# Altium footprint library ICPOWER.PcbLib: 71 footprints (part 1 of 5)
Each footprint in its own frame and in the unit in brackets; x right, y up, seen from the top. Pads: shape width x height; smd on the part's side, far side on the other; paste and mask are expansions set on the pad; w line width, h text height; cw(c..) or ccw(c..) is an arc to the next point about the centre after c.
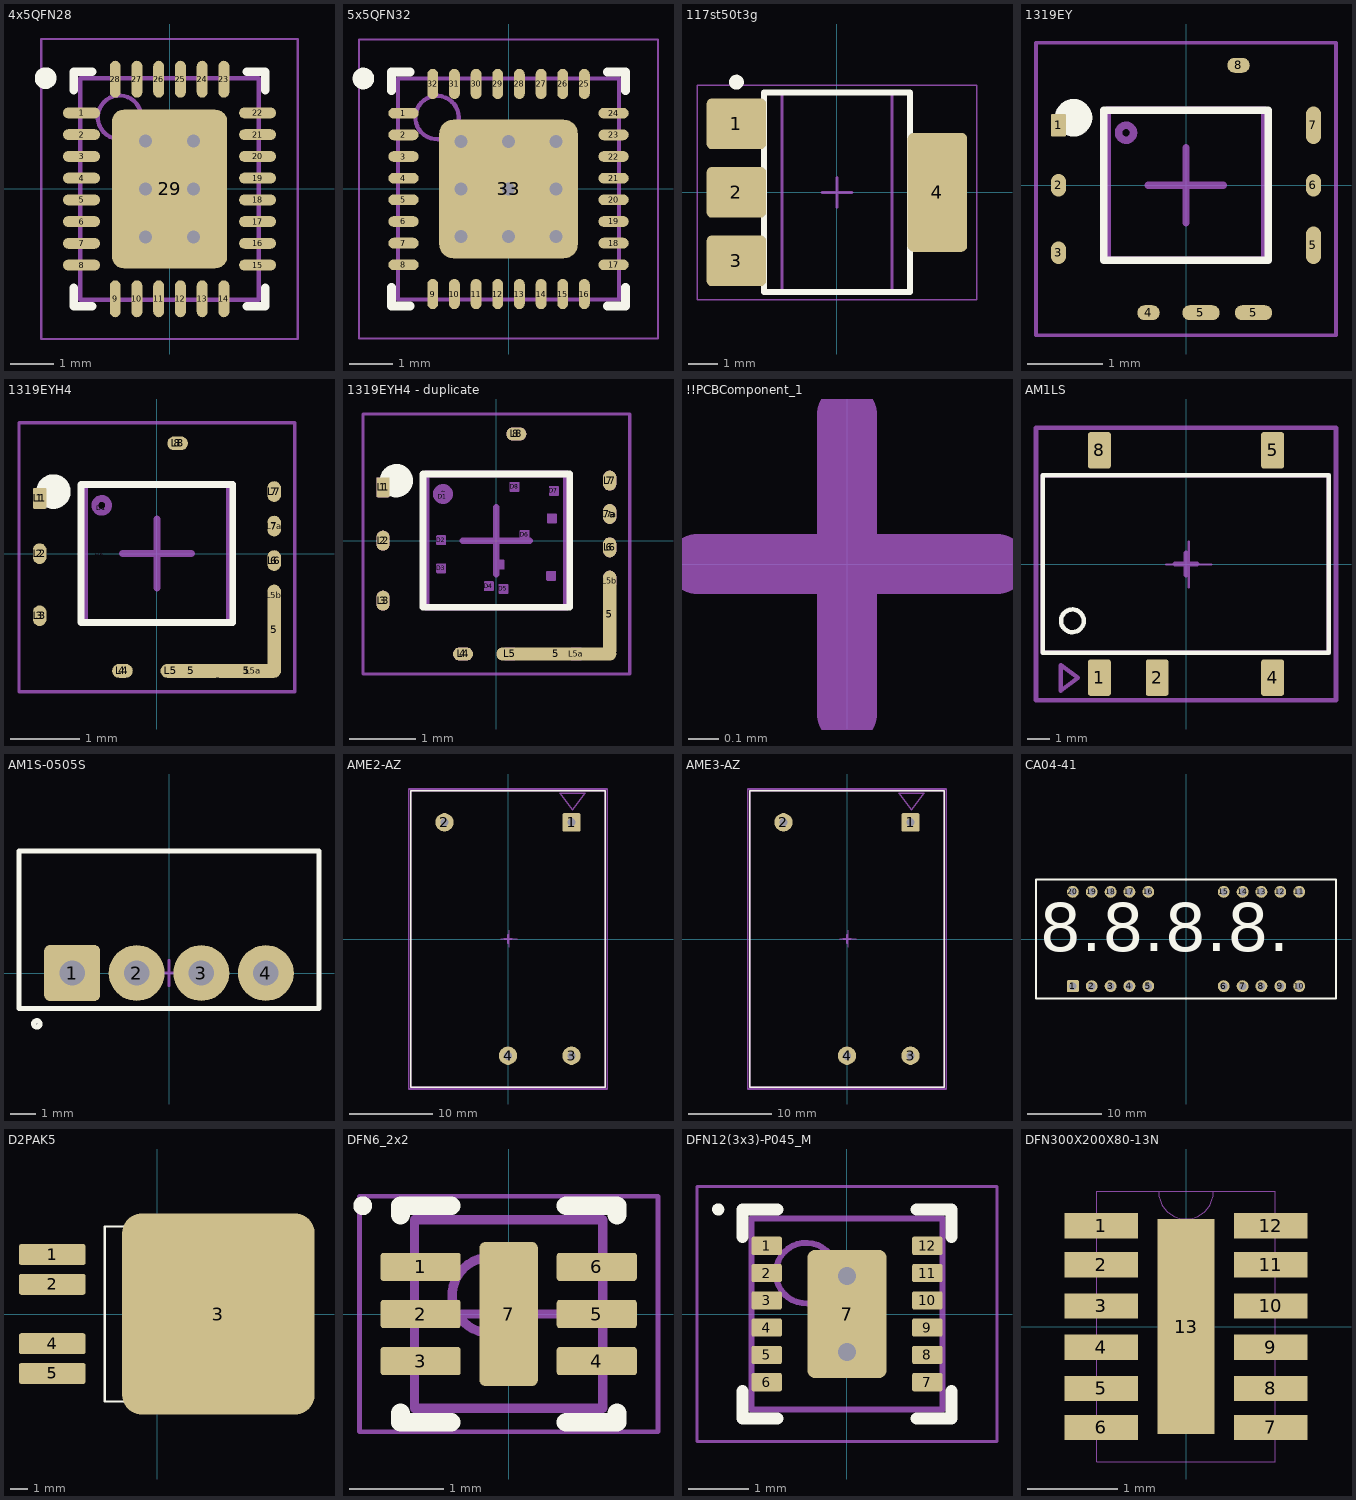
[diagram p0: the footprints below, top view; thin cyan lines are the x and y axes]

## 4x5QFN28 [mm] "QFN, 28-Leads, 4x5, IPC Low Density"
height 0.8
pads (29):
  oval 0.85x0.25 smd: 1(-2.025,1.75) 2(-2.025,1.25) 3(-2.025,0.75) 4(-2.025,0.25) 5(-2.025,-0.25) 6(-2.025,-0.75) 7(-2.025,-1.25) 8(-2.025,-1.75) 15(2.025,-1.75) 16(2.025,-1.25) 17(2.025,-0.75) 18(2.025,-0.25) 19(2.025,0.25) 20(2.025,0.75) 21(2.025,1.25) 22(2.025,1.75)
  oval 0.25x0.85 smd: 9(-1.25,-2.525) 10(-0.75,-2.525) 11(-0.25,-2.525) 12(0.25,-2.525) 13(0.75,-2.525) 14(1.25,-2.525) 23(1.25,2.525) 24(0.75,2.525) 25(0.25,2.525) 26(-0.25,2.525) 27(-0.75,2.525) 28(-1.25,2.525)
  rrect20% 2.65x3.65 smd: 29(0,0)
via 0.55,-1.1 diameter 0.6 hole 0.3
via -0.55,-1.1 diameter 0.6 hole 0.3
via 0.55,0 diameter 0.6 hole 0.3
via -0.55,0 diameter 0.6 hole 0.3
via 0.55,1.1 diameter 0.6 hole 0.3
via -0.55,1.1 diameter 0.6 hole 0.3
Top Overlay:
  circle w0.25: c-2.85,2.55 r0.125
  lines w0.2: -2.2,-2.275 -2.2,-2.7 -1.775,-2.7 ; -2.2,2.275 -2.2,2.7 -1.775,2.7 ; 1.775,-2.7 2.2,-2.7 2.2,-2.275 ; 1.775,2.7 2.2,2.7 2.2,2.275
Mechanical 13:
  circle w0.1: c-1.15,1.65 r0.5
  lines w0.1: -2.05,-2.55 2.05,-2.55 2.05,2.55 -2.05,2.55 -2.05,-2.55
Mechanical 15:
  lines w0.05: -2.95,-3.45 2.95,-3.45 2.95,3.45 -2.95,3.45 -2.95,-3.45
  lines w0.1: -0.5,0 0.5,0 ; 0,-0.5 0,0.5
3D body: height 0.8, standoff 0.03, extent -2.05,-2.55 2.05,2.55

## 5x5QFN32 [mm] "QFN, 32-Leads, 5x5, IPC Low Density"
height 0.8
pads (33):
  oval 0.7x0.25 smd: 1(-2.425,1.75) 2(-2.425,1.25) 3(-2.425,0.75) 4(-2.425,0.25) 5(-2.425,-0.25) 6(-2.425,-0.75) 7(-2.425,-1.25) 8(-2.425,-1.75) 17(2.425,-1.75) 18(2.425,-1.25) 19(2.425,-0.75) 20(2.425,-0.25) 21(2.425,0.25) 22(2.425,0.75) 23(2.425,1.25) 24(2.425,1.75)
  oval 0.25x0.7 smd: 9(-1.75,-2.425) 10(-1.25,-2.425) 11(-0.75,-2.425) 12(-0.25,-2.425) 13(0.25,-2.425) 14(0.75,-2.425) 15(1.25,-2.425) 16(1.75,-2.425) 25(1.75,2.425) 26(1.25,2.425) 27(0.75,2.425) 28(0.25,2.425) 29(-0.25,2.425) 30(-0.75,2.425) 31(-1.25,2.425) 32(-1.75,2.425)
  rrect20% 3.2x3.2 smd: 33(0,0)
via -1.1,1.1 diameter 0.6 hole 0.3
via 0,1.1 diameter 0.6 hole 0.3
via 1.1,1.1 diameter 0.6 hole 0.3
via -1.1,0 diameter 0.6 hole 0.3
via 0,0 diameter 0.6 hole 0.3
via 1.1,0 diameter 0.6 hole 0.3
via -1.1,-1.1 diameter 0.6 hole 0.3
via 0,-1.1 diameter 0.6 hole 0.3
via 1.1,-1.1 diameter 0.6 hole 0.3
Top Overlay:
  circle w0.25: c-3.35,2.55 r0.125
  lines w0.2: -2.7,-2.275 -2.7,-2.7 -2.275,-2.7 ; -2.7,2.275 -2.7,2.7 -2.275,2.7 ; 2.275,-2.7 2.7,-2.7 2.7,-2.275 ; 2.275,2.7 2.7,2.7 2.7,2.275
Mechanical 13:
  circle w0.1: c-1.65,1.65 r0.5
  lines w0.1: -2.55,-2.55 -2.55,2.55 2.55,2.55 2.55,-2.55 -2.55,-2.55
Mechanical 15:
  lines w0.05: -3.45,-3.45 -3.45,3.45 3.45,3.45 3.45,-3.45 -3.45,-3.45
  lines w0.1: -0.5,0 0.5,0 ; 0,-0.5 0,0.5
3D body: height 0.8, standoff 0.03, extent -2.55,-2.55 2.55,2.55

## 117st50t3g [mm] "117st50t3g"
height 1.8
pads (4):
  rrect20% 2x1.7 smd: 1(-3.375,2.3) 2(-3.375,0) 3(-3.375,-2.3)
  rrect20% 2x4 smd: 4(3.375,0)
Top Overlay:
  circle w0.25: c-3.375,3.7 r0.125
  lines w0.2: -2.45,-3.35 -2.45,3.35 2.45,3.35 2.45,-3.35 -2.45,-3.35
Mechanical 13:
  lines w0.1: -1.85,-3.35 -1.85,3.35 1.85,3.35 1.85,-3.35 -1.85,-3.35
Mechanical 15:
  lines w0.05: -4.699,-3.6 -4.699,3.6 4.699,3.6 4.699,-3.6 -4.699,-3.6
  lines w0.1: -0.5,0 0.5,0 ; 0,-0.5 0,0.5
3D body "SOT-223.step": height 1.7, standoff 0.02, extent -3.48,-3.25 3.48,3.25

## 1319EY [mm] "1319EY crystal"
height 1.75
pads (10):
  rrect20% 0.2x0.3 smd: 1(-1.7,0.8)
  oval 0.2x0.3 smd: 2(-1.7,0) 3(-1.7,-0.9) 6(1.7,0)
  oval 0.3x0.2 smd: 4(-0.5,-1.7) 8(0.7,1.6)
  oval 0.5x0.2 smd: 5(0.2,-1.7) 5(0.9,-1.7)
  oval 0.2x0.5 smd: 5(1.7,-0.8) 7(1.7,0.8)
Top Overlay:
  circle w0.25: c-1.5,0.9 r0.125
  lines w0.1: -1.1,-1 -1.1,1 1.1,1 1.1,-1 -1.1,-1
Mechanical 13:
  circle w0.1: c-0.8,0.7 r0.1
  lines w0.1: -1.05,-1 -1.05,1 1.05,1 1.05,-1 -1.05,-1
Mechanical 15:
  lines w0.05: -2,-2 -2,1.9 2,1.9 2,-2 -2,-2
  lines w0.1: -0.5,0 0.5,0 ; 0,-0.5 0,0.5

## 1319EYH4 [mm] "1319EY crystal"
height 1.75
pads (33):
  rrect20% 0.2x0.3 smd: 1(-1.7,0.8)
  oval 0.2x0.3 smd: 2(-1.7,0) 3(-1.7,-0.9) 6(1.7,-0.1) 7(1.7,0.4) 7(1.7,0.9)
  oval 0.3x0.2 smd: 4(-0.5,-1.7) 8(0.3,1.6)
  oval 0.9x0.2 smd: 5(0.5,-1.7)
  oval 1x0.2 smd: 5(1.3,-1.7)
  oval 0.2x1.3 smd: 5(1.7,-1.1)
  rrect20% 0.15x0.15 on Mid1: D1(-0.806,0.66) D2(-0.827,0.007) D3(-0.827,-0.415) D4(-0.112,-0.683) D5(0.106,-0.723) D5a(0.051,-0.36) D5b(0.823,-0.527) D6(0.425,0.088) D7(0.864,0.746) D7a(0.834,0.333) D8(0.273,0.807)
  rrect20% 0.2x0.3 on Mid1: L1(-1.7,0.8)
  oval 0.2x0.3 on Mid1: L2(-1.7,0) L3(-1.7,-0.9) L5b(1.7,-0.6) L6(1.7,-0.1) L7(1.7,0.9) L7a(1.7,0.4)
  oval 0.3x0.2 on Mid1: L4(-0.5,-1.7) L5(0.2,-1.7) L5a(1.4,-1.7) L8(0.3,1.6)
Top Overlay:
  circle w0.25: c-1.5,0.9 r0.125
  lines w0.1: -1.1,-1 1.1,-1 1.1,1 -1.1,1 -1.1,-1
Mechanical 13:
  circle w0.1: c-0.8,0.7 r0.1
  lines w0.1: -1.05,-1 1.05,-1 1.05,1 -1.05,1 -1.05,-1
Mechanical 15:
  lines w0.05: -2,-2 2,-2 2,1.9 -2,1.9 -2,-2
  lines w0.1: -0.5,0 0.5,0 ; 0,-0.5 0,0.5

## 1319EYH4 - duplicate [mm] "1319EY crystal"
height 1.75
pads (32):
  rrect20% 0.2x0.3 smd: 1(-1.7,0.8)
  oval 0.2x0.3 smd: 2(-1.7,0) 3(-1.7,-0.9) 6(1.7,-0.1) 7(1.7,0.9) 7a(1.7,0.4)
  oval 0.3x0.2 smd: 4(-0.5,-1.7) 8(0.3,1.6)
  oval 1.8x0.2 smd: 5(0.9,-1.7)
  oval 0.2x1.3 smd: 5(1.7,-1.1)
  rrect20% 0.15x0.15 on Mech32: D1(-0.806,0.66) D2(-0.827,0.007) D3(-0.827,-0.415) D4(-0.112,-0.683) D5(0.106,-0.723) D5a(0.051,-0.36) D5b(0.823,-0.527) D6(0.425,0.088) D7(0.864,0.746) D7a(0.834,0.333) D8(0.273,0.807)
  rrect20% 0.2x0.3 on Mech32: L1(-1.7,0.8)
  oval 0.2x0.3 on Mech32: L2(-1.7,0) L3(-1.7,-0.9) L5b(1.7,-0.6) L6(1.7,-0.1) L7(1.7,0.9) L7a(1.7,0.4)
  oval 0.3x0.2 on Mech32: L4(-0.5,-1.7) L5(0.2,-1.7) L5a(1.2,-1.7) L8(0.3,1.6)
Top Overlay:
  circle w0.25: c-1.5,0.9 r0.125
  lines w0.1: -1.1,-1 1.1,-1 1.1,1 -1.1,1 -1.1,-1
Mechanical 13:
  circle w0.1: c-0.8,0.7 r0.1
  lines w0.1: -1.05,-1 1.05,-1 1.05,1 -1.05,1 -1.05,-1
Mechanical 15:
  lines w0.05: -2,-2 2,-2 2,1.9 -2,1.9 -2,-2
  lines w0.1: -0.5,0 0.5,0 ; 0,-0.5 0,0.5

## !!PCBComponent_1 [mm]
M3_comm_top:
  text ".comment" at -0.9,-0.3 h1
M5_asm_top:
  text ".Designator" at -1,1.3 h1
M7_courtyard_top:
  lines w0.2: -0.5,0 0.5,0 ; 0,-0.5 0,0.5

## AM1LS [mm] "AM1LS-0505S-NZ"
pads (5):
  rrect20% 1x1.6 smd: 1(-3.81,-5) 2(-1.27,-5) 4(3.81,-5) 5(3.81,5) 8(-3.81,5)
Top Overlay:
  circle w0.2: c-5,-2.5 r0.5
  lines w0.2: -6.31,-3.9 6.29,-3.9 6.29,3.9 -6.31,3.9 -6.31,-3.9
M3_comm_top:
  text ".comment" at -3.01,-0.55 h2
M5_asm_top:
  lines w0.2: -6.31,-3.9 -6.31,3.9 6.29,3.9 6.29,-3.9 -6.31,-3.9 ; -5.51,-5.575 -4.757,-5.01 -5.51,-4.445 -5.51,-5.575
  text ".Designator" at -3.11,6.45 h2
M7_courtyard_top:
  lines w0.2: -0.5,0 0.5,0 ; 0,-0.5 0,0.5 ; -6.6,-6 -6.6,6 6.6,6 6.6,-6 -6.6,-6
Mechanical 15:
  lines w0.1: -0.88,-0.02 1.12,-0.02 ; 0.12,-1.02 0.12,0.98
3D body "AM1LS-NZ.step": height 7, standoff 0, extent -6.35,-5.6 6.35,5.6

## AM1S-0505S [mm] "AM1S-0505SH30Z"
pads (4):
  rrect20% 2.2x2.2 hole 1: 1(-3.81,0)
  round 2.2 hole 1: 2(-1.27,0) 3(1.27,0) 4(3.81,0)
Top Overlay:
  circle w0.2: c-5.2,-2 r0.125
  lines w0.2: -5.9,-1.4 -5.9,4.8 5.9,4.8 5.9,-1.4 -5.9,-1.4
M3_comm_top:
  text ".comment" at 0,0 h1
M5_asm_top:
  circle w0.1: c-5.2,-2 r0.1
  lines w0.1: -5.9,-1.4 5.9,-1.4 5.9,4.8 -5.9,4.8 -5.9,-1.4
  text ".Designator" at -1.5,5 h1
M7_courtyard_top:
  lines w0.1: -0.5,0 0.5,0 ; 0,-0.5 0,0.5
3D body "User Library-AM1S-Z.STEP": height 10.15, standoff -3.05, extent -5.842,-1.35 5.842,4.75

## AME2-AZ [mm] "AME2-AZ"
pads (4):
  rrect20% 2.2x2.2 hole 1: 1(7.62,14)
  round 2.2 hole 1: 2(-7.62,14) 3(7.62,-14) 4(0,-14)
Top Overlay:
  lines w0.2: -11.655,-17.8 11.655,-17.8 11.655,17.8 -11.655,17.8 -11.655,-17.8
M3_comm_top:
  text ".comment" at -3,-0.5 h2
M5_asm_top:
  lines w0.2: -11.655,-17.8 -11.655,17.8 11.655,17.8 11.655,-17.8 -11.655,-17.8 ; 6.24,17.5 7.74,15.5 9.24,17.5 6.24,17.5
  text ".Designator" at -2.2,16.5 h2
M7_courtyard_top:
  lines w0.2: -0.5,0 0.5,0 ; 0,-0.5 0,0.5 ; -11.9,-18 11.9,-18 11.9,18 -11.9,18 -11.9,-18
Mechanical 15:
  lines w0.1: -0.87,0.03 1.13,0.03 ; 0.13,-0.97 0.13,1.03
3D body "AME2-24SBAZ.STEP": height 19.32, standoff -4.1, extent -11.655,-17.8 11.655,17.8

## AME3-AZ [mm] "AME3-AZ"
pads (4):
  rrect20% 2.2x2.2 hole 1: 1(7.62,14)
  round 2.2 hole 1: 2(-7.62,14) 3(7.62,-14) 4(0,-14)
Top Overlay:
  lines w0.2: -11.655,-17.8 11.655,-17.8 11.655,17.8 -11.655,17.8 -11.655,-17.8
M3_comm_top:
  text ".comment" at -3,-0.5 h2
M5_asm_top:
  lines w0.2: -11.655,-17.8 -11.655,17.8 11.655,17.8 11.655,-17.8 -11.655,-17.8 ; 6.24,17.5 7.74,15.5 9.24,17.5 6.24,17.5
  text ".Designator" at -2.2,16.5 h2
M7_courtyard_top:
  lines w0.2: -0.5,0 0.5,0 ; 0,-0.5 0,0.5 ; -11.9,-18 11.9,-18 11.9,18 -11.9,18 -11.9,-18
Mechanical 15:
  lines w0.1: -0.87,0.03 1.13,0.03 ; 0.13,-0.97 0.13,1.03
3D body: height 19.32, standoff 0.05, extent -11.655,-17.8 11.655,17.8
3D body: height 0, standoff -2, extent 7.124,-14.499 8.12,-13.501
3D body: height 0, standoff -2, extent -0.496,-14.499 0.5,-13.501
3D body: height 0, standoff -2, extent 7.124,13.501 8.12,14.499
3D body: height 0, standoff -2, extent -8.116,13.501 -7.12,14.499

## CA04-41 [mm] "kingbright 0.4\" QUAD DIGIT RED GREEN YELLOW LED DISPLAY 4-Digit 7-Segment Thru-Hole Display"
height 11.4
pads (20):
  rrect20% 1.6x1.6 hole 1: 1(-15.24,-6.35)
  round 1.6 hole 1: 2(-12.7,-6.35) 3(-10.16,-6.35) 4(-7.62,-6.35) 5(-5.08,-6.35) 6(5.08,-6.35) 7(7.62,-6.35) 8(10.16,-6.35) 9(12.7,-6.35) 10(15.24,-6.35) 11(15.24,6.35) 12(12.7,6.35) 13(10.16,6.35) 14(7.62,6.35) 15(5.08,6.35) 16(-5.08,6.35) 17(-7.62,6.35) 18(-10.16,6.35) 19(-12.7,6.35) 20(-15.24,6.35)
Top Overlay:
  lines w0.254: -20.2,-8 20.2,-8 20.2,8 -20.2,8 -20.2,-8
  text "." at -18.415,-6.985 h11
  text "8.8.8.8." at -19.685,-3.81 h11
M3_comm_top:
  text ".comment" at -3.81,-5.08 h1.52
3D body "King Bright CA04-41.step": height 6.9, standoff -4.1, extent -20.2,-8 20.2,8

## D2PAK5 [mm] "AUIR3313S"
pads (5):
  rrect20% 3.8x1.2 smd: 1(-6,3.4) 2(-6,1.7) 4(-6,-1.7) 5(-6,-3.4)
  rrect20% 11x11.5 smd: 3(3.5,0)
Top Overlay:
  region: 5.8,5 6.5,5 7,4 7,-4 6.5,-5 5.8,-5
  lines w0.127: -3,-5 -3,5 5.8,5 5.8,-5 -3,-5
3D body "SW3dPS-TO263-5S.STEP": height 4.78, standoff -0.02, extent -7.53,-5 8.14,5

## DFN6_2x2 [mm] "STLQ020PUR,  SON, 6-Leads, Body 2,00x2,00mm, Pitch 0,50mm, Thermal Pad 1,53x0,62mm, IPC Medium Density"
height 0.95
pads (7):
  rrect20% 0.85x0.3 smd: 1(-0.935,0.5) 2(-0.935,0) 3(-0.935,-0.5) 4(0.935,-0.5) 5(0.935,0) 6(0.935,0.5)
  rrect20% 0.62x1.53 smd: 7(0,0)
Top Overlay:
  circle w0.1: c-1.55,1.15 r0.05
  lines w0.2: -1.15,-1.05 -1.15,-1.15 -0.61,-1.15 ; -1.15,1.05 -1.15,1.15 -0.61,1.15 ; 0.61,-1.15 1.15,-1.15 1.15,-1.05 ; 0.61,1.15 1.15,1.15 1.15,1.05
M3_comm_top:
  text ".comment" at -0.9,-0.3 h1
M5_asm_top:
  circle w0.1: c-0.2,0.2 r0.4
  lines w0.1: -1,-1 1,-1 1,1 -1,1 -1,-1
  text ".Designator" at -1,1.3 h1
M7_courtyard_top:
  lines w0.05: -1.585,-1.25 1.585,-1.25 1.585,1.25 -1.585,1.25 -1.585,-1.25
  lines w0.1: -0.5,0 0.5,0 ; 0,-0.5 0,0.5
3D body "DFN6_2x2.step": height 0.95, standoff 0, extent -1.02,-1 1.02,1

## DFN12(3x3)-P045_M [mm] "SON, 8-Leads, Body 3x3mm, Pitch 0.5mm, Thermal Pad 2.38x1.64mm, IPC Low Density"
height 1
pads (13):
  rrect20% 0.5x0.3 smd: 1(-1.325,1.125) 2(-1.325,0.675) 3(-1.325,0.225) 4(-1.325,-0.225) 5(-1.325,-0.675) 6(-1.325,-1.125) 7(1.325,-1.125) 8(1.325,-0.675) 9(1.325,-0.225) 10(1.325,0.225) 11(1.325,0.675) 12(1.325,1.125)
  rrect20% 1.31x2.12 smd paste-0.82: 7(0,0)
via 0,0.625 diameter 0.6 hole 0.3
via 0,-0.625 diameter 0.6 hole 0.3
Top Overlay:
  circle w0.1: c-2.125,1.725 r0.05
  lines w0.2: -1.725,-1.275 -1.725,-1.725 -1.15,-1.725 ; -1.725,1.275 -1.725,1.725 -1.15,1.725 ; 1.15,-1.725 1.725,-1.725 1.725,-1.275 ; 1.15,1.725 1.725,1.725 1.725,1.275
Top Paste:
  rectangle: -0.635,-1.15 0.635,-0.725
  rectangle: -0.635,-0.525 0.635,-0.1
  rectangle: -0.635,0.725 0.635,1.15
  rectangle: -0.635,0.1 0.635,0.525
Mechanical 13:
  circle w0.1: c-0.675,0.675 r0.5
  lines w0.1: -1.575,-1.575 -1.575,1.575 1.575,1.575 1.575,-1.575 -1.575,-1.575
Mechanical 15:
  lines w0.05: -2.475,-2.1 -2.475,2.1 2.475,2.1 2.475,-2.1 -2.475,-2.1
  lines w0.1: -0.5,0 0.5,0 ; 0,-0.5 0,0.5
3D body: height 1, standoff 0, extent -1.575,-1.575 1.575,1.575

## DFN300X200X80-13N [mil]
pads (13):
  rect 32x11 smd: 1(-37,44) 2(-37,27) 3(-37,9) 4(-37,-9) 5(-37,-27) 6(-37,-44) 7(37,-44) 8(37,-27) 9(37,-9) 10(37,9) 11(37,27) 12(37,44)
  rect 25x94 smd: 13(0,0)
M1_3D_TOP:
  lines w0: -12,59 ccw(c0,59) 12,59 ; -12,59 12,59 ; -12,59 -39,59 -39,-59 39,-59 39,59 12,59